# Altium footprint library ACTION标准库.pcblib: 504 footprints (part 29 of 32)
Each footprint in its own frame and in the unit in brackets; x right, y up, seen from the top. Pads: shape width x height; smd on the part's side, far side on the other; paste and mask are expansions set on the pad; w line width, h text height; cw(c..) or ccw(c..) is an arc to the next point about the centre after c.
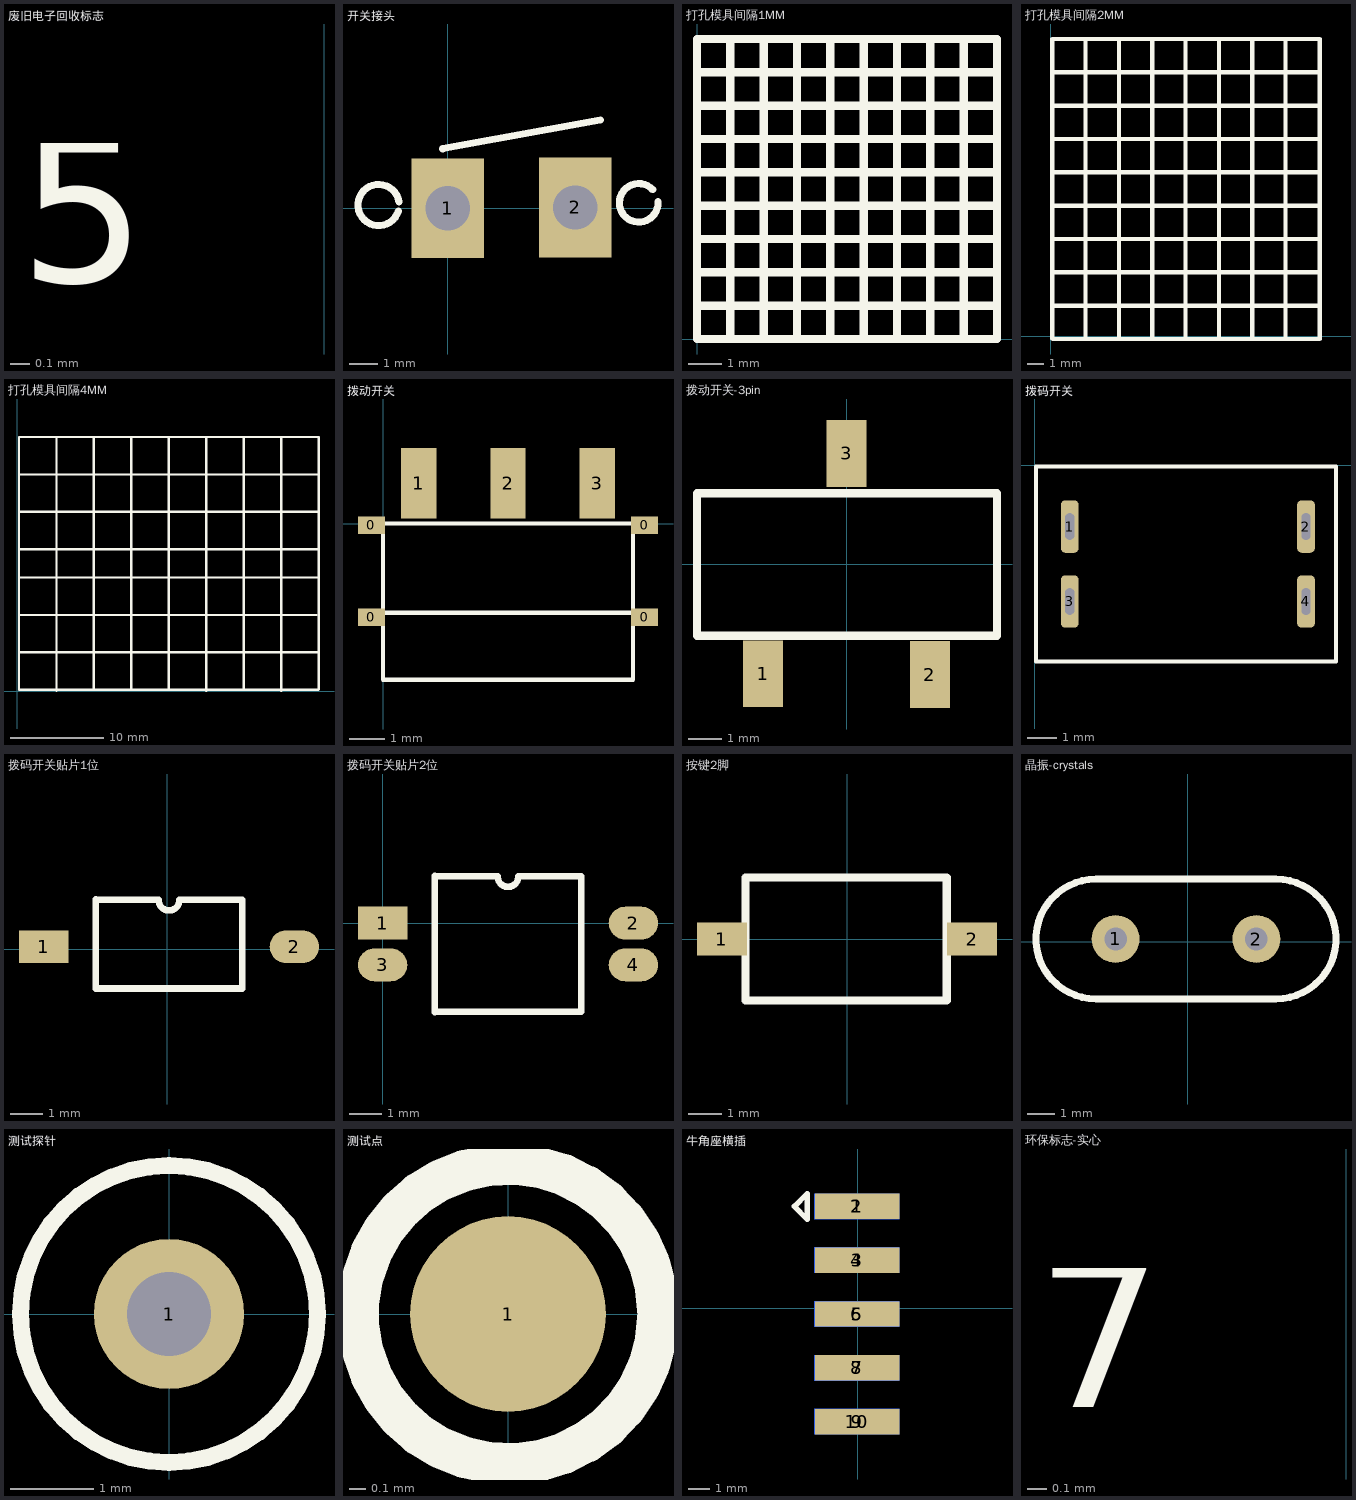
[diagram p28: the footprints below, top view; thin cyan lines are the x and y axes]

## 废旧电子回收标志 [mm]
Top Overlay:
  text "5" at -1.549,-2.565 h1.52

## 开关接头 [mil]
pads (2):
  rect 101.5x139.06 hole 61.69: 1(0,0) 2(178,1)
Top Overlay:
  lines w10: -68.81,-3.81 cw(c-96.42,4.37) -68,9 ; -7,83 213,123 ; 286,26 ccw(c266.5,7.43) 293.37,9.22

## 打孔模具间隔1MM [mm]
Top Overlay:
  lines w0.254: 0,1 9,1 ; 0,2 9,2 ; 0,3 9,3 ; 0,4 9,4 ; 0,5 9,5 ; 0,6 9,6 ; 0,7 9,7 ; 0,8 9,8 ; 1,0 1,9 ; 2,0 2,9 ; 3,0 3,9 ; 4,0 4,9 ; 5,0 5,9 ; 6,0 6,9 ; 7,0 7,9 ; 8,0 8,9 ; 0,0 9,0 9,9 0,9 0,0

## 打孔模具间隔2MM [mm]
Top Overlay:
  lines w0.254: 0.076,1.845 16.027,1.845 ; 0.076,3.845 16.104,3.845 ; 0.076,5.845 16.027,5.845 ; 0.076,7.845 16.002,7.845 ; 0.076,9.845 16.104,9.845 ; 0.076,11.845 16.078,11.845 ; 0.076,13.845 16.053,13.845 ; 0.076,15.845 16.053,15.845 ; 2.076,-0.076 2.076,17.845 ; 4.076,-0.127 4.076,17.845 ; 6.076,-0.076 6.076,17.845 ; 8.076,-0.076 8.076,17.845 ; 10.076,0 10.076,17.845 ; 12.076,-0.076 12.076,17.845 ; 14.076,-0.127 14.076,17.845 ; 0.076,-0.127 0.105,-0.155 16.129,-0.155 16.129,17.845 0.076,17.845 0.076,-0.127

## 打孔模具间隔4MM [mm]
Top Overlay:
  lines w0.254: 0.178,0.169 32.131,0.169 ; 0.178,0.178 0.178,27.169 32.055,27.169 ; 0.178,4.169 32.207,4.169 ; 0.178,8.169 31.902,8.169 ; 0.178,12.169 32.055,12.169 ; 0.178,15.169 32.055,15.169 ; 0.178,19.169 32.131,19.169 ; 0.178,23.169 32.131,23.169 ; 4.178,0.051 4.178,27.169 ; 8.178,0.305 8.178,27.169 ; 12.178,0.178 12.178,27.169 ; 16.178,0.406 16.178,27.169 ; 20.178,0.051 20.178,27.169 ; 24.178,0.229 24.178,27.169 ; 28.178,0.051 28.178,27.169 ; 32.178,0.229 32.178,27.169

## 拨动开关 [mil]
pads (7):
  rect 30x19.68 smd: 0(-13,-105) 0(-13,-2) 0(293,-105) 0(293,-2)
  rect 39.37x78.74 smd: 1(40,45) 2(140,45) 3(240,45)
Top Overlay:
  lines w4.92: 0,-98.43 0,0 279.53,0 ; 0.47,-100 280,-100 280,-1.57 ; 279.53,-100 0,-100 0,-175 280,-175 280,-101.57

## 拨动开关-3pin [mm]
pads (3):
  rect 1.2x2 smd: 1(-2.5,-3.289) 2(2.5,-3.315) 3(0,3.315)
Top Overlay:
  lines w0.254: -4.483,-2.146 -4.483,2.121 4.483,2.121 ; -4.458,-2.146 4.509,-2.146 4.509,2.121

## 拨码开关 [mil]
pads (4):
  rrect50% 23.62x70 hole 11.81 slot 35.43 at 90 deg: 1(47,-82) 2(362,-82) 3(47,-182) 4(362,-182)
Top Overlay:
  lines w5: 2,-262 2,-2 402,-2 402,-262 2,-262

## 拨码开关贴片1位 [mm]
pads (2):
  rect 1.5x1 smd: 1(-3.759,0.076)
  oval 1.5x1 smd: 2(3.861,0.076)
Top Overlay:
  lines w0.2: -2.174,1.499 -0.267,1.499 ccw(c0.051,1.499) 0.368,1.499 2.276,1.499 2.276,-1.194 -2.174,-1.194 -2.174,1.511

## 拨码开关贴片2位 [mm]
pads (4):
  rect 1.5x1 smd: 1(0,0)
  oval 1.5x1 smd: 2(7.62,0) 3(0,-1.27) 4(7.62,-1.27)
Top Overlay:
  lines w0.2: 1.585,-2.705 1.585,1.435 ; 1.585,-2.692 6.035,-2.692 6.035,1.422 4.127,1.422 cw(c3.81,1.422) 3.492,1.422 1.585,1.422

## 按键2脚 [mm]
pads (2):
  rect 1.5x1 smd: 1(-3.772,0) 2(3.772,0)
Top Overlay:
  lines w0.254: -3.061,-1.854 3.01,-1.854 3.01,1.854 -3.061,1.854 -3.061,-1.854

## 晶振-crystals [mil]
pads (2):
  round 68 hole 32: 1(-102.36,3.94) 2(97.64,3.94)
Top Overlay:
  lines w10: -130.36,-81.07 cw(c-130.36,3.94) -130.36,88.94 125.64,88.94 cw(c125.64,3.94) 125.64,-81.07 -130.36,-81.07
3D body "晶振.STEP": height 118.11, standoff -78.74, extent -235.22,-74.8 237.22,82.68

## 测试探针 [mm] "Keystone Compact loops"
height 5.588
pads (1):
  round 1.8 hole 1: 1(0,0)
Top Overlay:
  circle w0.203: c0,0 r1.778
Mechanical 5:
  circle w0.127: c0,0 r1.796
3D body "Keystone_5006.stp": height 5.72, standoff -3.3, extent -1.613,-1.603 1.587,1.596

## 测试点 [mm]
pads (1):
  round 1.2 smd: 1(0,0)
Top Overlay:
  circle w0.254: c0,0 r0.92

## 牛角座横插 [mm]
pads (10):
  rect 4x1.2 smd: 1(-0.025,4.801) 3(-0.025,2.261) 5(-0.025,-0.279) 7(-0.025,-2.819) 9(-0.025,-5.359)
  rect 4x1.2 smd far side: 2(-0.051,4.801) 4(-0.051,2.261) 6(-0.051,-0.279) 8(-0.051,-2.819) 10(-0.051,-5.359)
Top Overlay:
  lines w0.254: -2.997,4.801 -2.388,5.41 -2.388,4.191 -2.997,4.801

## 环保标志-实心 [mm]
Top Overlay:
  text "7" at -1.575,-1.803 h1.52